# Altium footprint library SAMTEC SMD.PcbLib: 165 footprints (part 11 of 17)
Each footprint in its own frame and in the unit in brackets; x right, y up, seen from the top. Pads: shape width x height; smd on the part's side, far side on the other; paste and mask are expansions set on the pad; w line width, h text height; cw(c..) or ccw(c..) is an arc to the next point about the centre after c.
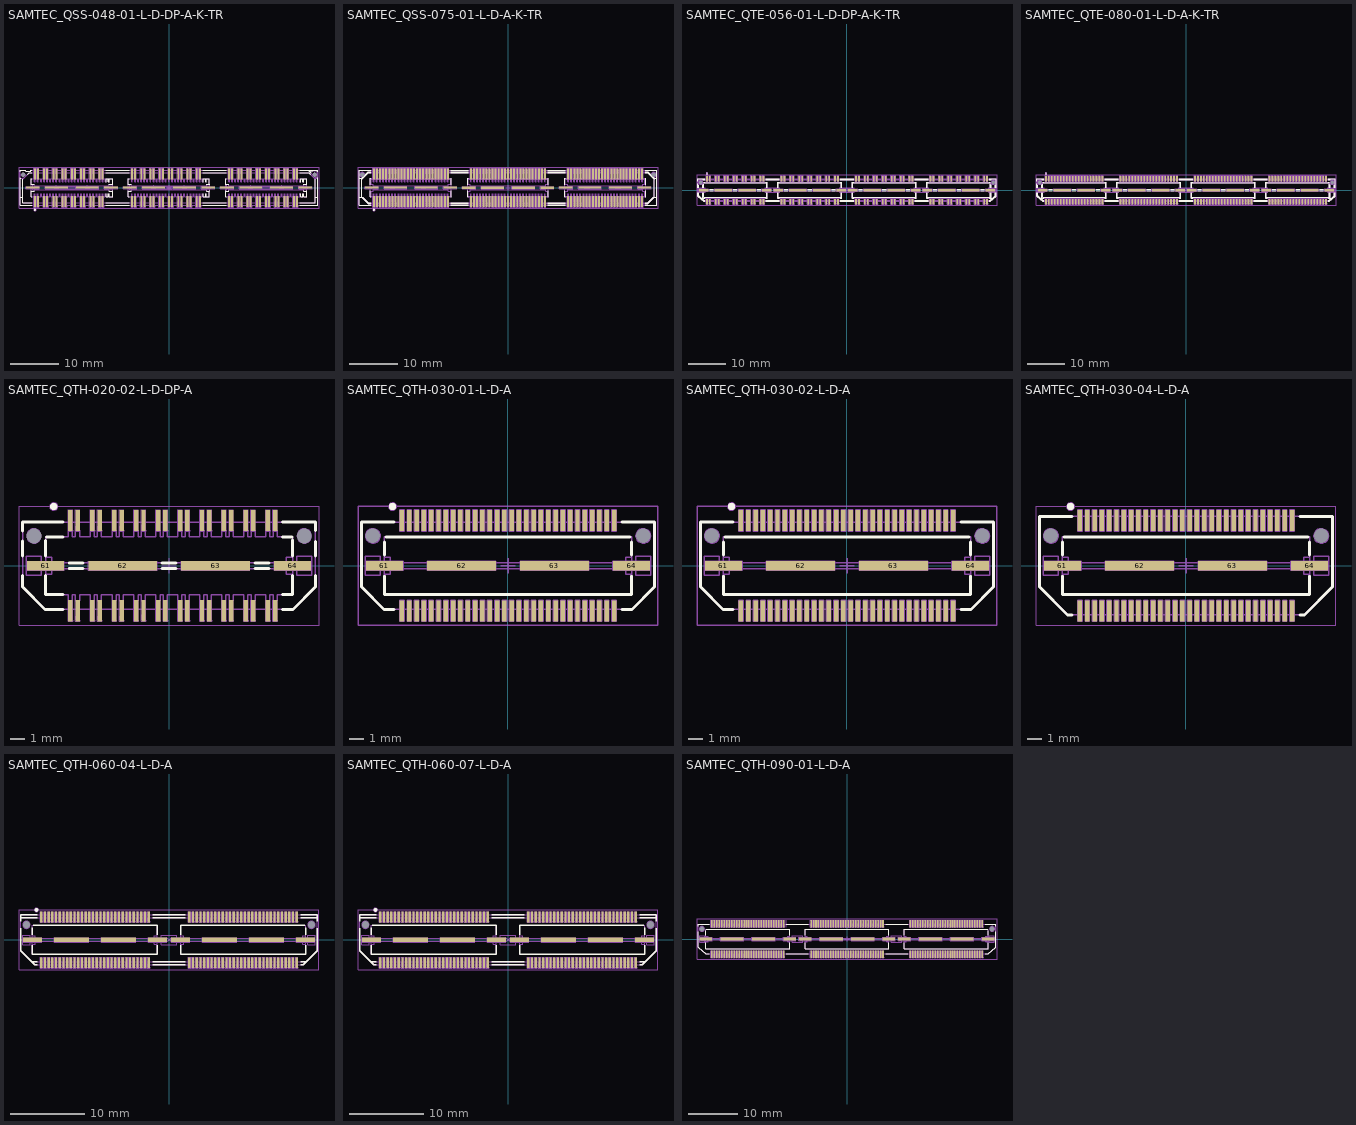
[diagram p10: the footprints below, top view; thin cyan lines are the x and y axes]

## SAMTEC_QSS-048-01-L-D-DP-A-K-TR [mm] "96 Contacts Female, Pitch 0.635mm, Straight Double Row Differential Pair High Speed Board to Board Socket"
height 3.63
pads (110):
  rect 0.406x2.273 smd mask+0: 1(-27.623,-2.865) 2(-27.623,2.865) 3(-26.988,-2.865) 4(-26.988,2.865) 5(-25.718,-2.865) 6(-25.718,2.865) 7(-25.083,-2.865) 8(-25.083,2.865) 9(-23.813,-2.865) 10(-23.813,2.865) 11(-23.178,-2.865) 12(-23.178,2.865) 13(-21.908,-2.865) 14(-21.908,2.865) 15(-21.273,-2.865) 16(-21.273,2.865) 17(-20.003,-2.865) 18(-20.003,2.865) 19(-19.368,-2.865) 20(-19.368,2.865) 21(-18.098,-2.865) 22(-18.098,2.865) 23(-17.463,-2.865) 24(-17.463,2.865) 25(-16.193,-2.865) 26(-16.193,2.865) 27(-15.558,-2.865) 28(-15.558,2.865) 29(-14.288,-2.865) 30(-14.288,2.865) 31(-13.653,-2.865) 32(-13.653,2.865) 33(-7.62,-2.865) 34(-7.62,2.865) 35(-6.985,-2.865) 36(-6.985,2.865) 37(-5.715,-2.865) 38(-5.715,2.865) 39(-5.08,-2.865) 40(-5.08,2.865) 41(-3.81,-2.865) 42(-3.81,2.865) 43(-3.175,-2.865) 44(-3.175,2.865) 45(-1.905,-2.865) 46(-1.905,2.865) 47(-1.27,-2.865) 48(-1.27,2.865) 49(0,-2.865) 50(0,2.865) 51(0.635,-2.865) 52(0.635,2.865) 53(1.905,-2.865) 54(1.905,2.865) 55(2.54,-2.865) 56(2.54,2.865) 57(3.81,-2.865) 58(3.81,2.865) 59(4.445,-2.865) 60(4.445,2.865) 61(5.715,-2.865) 62(5.715,2.865) 63(6.35,-2.865) 64(6.35,2.865) 65(12.383,-2.865) 66(12.383,2.865) 67(13.018,-2.865) 68(13.018,2.865) 69(14.288,-2.865) 70(14.288,2.865) 71(14.923,-2.865) 72(14.923,2.865) 73(16.193,-2.865) 74(16.193,2.865) 75(16.828,-2.865) 76(16.828,2.865) 77(18.098,-2.865) 78(18.098,2.865) 79(18.733,-2.865) 80(18.733,2.865) 81(20.003,-2.865) 82(20.003,2.865) 83(20.638,-2.865) 84(20.638,2.865) 85(21.908,-2.865) 86(21.908,2.865) 87(22.543,-2.865) 88(22.543,2.865) 89(23.813,-2.865) 90(23.813,2.865) 91(24.448,-2.865) 92(24.448,2.865) 93(25.718,-2.865) 94(25.718,2.865) 95(26.353,-2.865) 96(26.353,2.865)
  rect 2.794x0.432 smd mask+0: 97(-28.067,0) 100(-11.938,0) 101(-8.065,0) 104(8.065,0) 105(11.938,0) 108(28.067,0)
  rect 4.699x0.432 smd mask+0: 98(-23.178,0) 99(-16.825,0) 102(-3.175,0) 103(3.175,0) 106(16.828,0) 107(23.178,0)
  round 0.5 hole 1 unplated mask+0.25: 163(-30,2.657) 164(30,2.657)
Top Overlay:
  circle w0.25: c-27.603,-4.54 r0.125
  lines w0.2: -30.639,-1.968 -30.131,-1.968 ; -30.639,1.968 -30.571,1.968 ; -30.639,2.029 -30.639,-3.62 -28.226,-3.62 ; -30.639,3.305 -30.639,3.62 -29.496,3.62 -29.496,3.41 ; -29.436,3.366 -28.48,3.366 -28.48,3.62 -28.226,3.62 ; -28.321,-0.616 -28.321,-0.699 ; -28.321,0.616 -28.321,0.699 ; -28.226,-1.829 -28.321,-1.829 -28.321,-0.699 ; -28.226,1.829 -28.321,1.829 -28.321,0.699 ; -27.75,-0.616 -27.75,-0.699 -28.321,-0.699 ; -27.75,0.616 -27.75,0.699 -28.321,0.699 ; -13.05,-3.62 -8.223,-3.62 ; -13.05,-1.245 -12.916,-1.245 -12.916,-1.829 -12.484,-1.829 -12.484,-1.245 -12.281,-1.245 -12.281,-1.829 -11.576,-1.829 -11.576,-0.699 ; -13.05,1.245 -12.916,1.245 -12.916,1.829 -12.484,1.829 -12.484,1.245 -12.281,1.245 -12.281,1.829 -11.576,1.829 -11.576,0.699 ; -13.05,3.62 -8.223,3.62 ; -12.256,-0.616 -12.256,-0.699 -11.576,-0.699 ; -12.256,0.616 -12.256,0.699 -11.576,0.699 ; -11.576,-0.616 -11.576,-0.699 ; -11.576,0.616 -11.576,0.699 ; -8.426,-0.616 -8.426,-0.699 ; -8.426,0.616 -8.426,0.699 ; -8.223,-1.829 -8.426,-1.829 -8.426,-0.699 ; -8.223,1.829 -8.426,1.829 -8.426,0.699 ; -7.747,-0.616 -7.747,-0.699 -8.426,-0.699 ; -7.747,0.616 -7.747,0.699 -8.426,0.699 ; 6.953,-3.62 11.78,-3.62 ; 6.953,-1.245 7.087,-1.245 7.087,-1.829 7.518,-1.829 7.518,-1.245 7.722,-1.245 7.722,-1.829 8.322,-1.829 8.322,-0.699 ; 6.953,1.245 7.087,1.245 7.087,1.829 7.518,1.829 7.518,1.245 7.722,1.245 7.722,1.829 8.319,1.829 8.319,0.699 ; 6.953,3.62 11.78,3.62 ; 7.747,-0.616 7.747,-0.699 8.322,-0.699 ; 7.747,0.616 7.747,0.699 8.319,0.699 ; 8.319,0.616 8.319,0.699 ; 8.322,-0.616 8.322,-0.699 ; 11.684,-0.616 11.684,-0.699 ; 11.684,0.616 11.684,0.699 ; 11.78,-1.829 11.684,-1.829 11.684,-0.699 ; 11.78,1.829 11.684,1.829 11.684,0.699 ; 12.256,-0.616 12.256,-0.699 11.684,-0.699 ; 12.256,0.616 12.256,0.699 11.684,0.699 ; 26.956,-3.62 30.639,-3.62 30.639,2.029 ; 26.956,-1.245 27.089,-1.245 27.089,-1.829 27.521,-1.829 27.521,-1.245 27.724,-1.245 27.724,-1.829 28.321,-1.829 28.321,-0.699 ; 26.956,1.245 27.089,1.245 27.089,1.829 27.521,1.829 27.521,1.245 27.724,1.245 27.724,1.829 28.321,1.829 28.321,0.699 ; 26.956,3.62 30.639,3.62 30.639,3.305 ; 27.75,-0.616 27.75,-0.699 28.321,-0.699 ; 27.75,0.616 27.75,0.699 28.321,0.699 ; 28.321,-0.616 28.321,-0.699 ; 28.321,0.616 28.321,0.699 ; 29.202,3.075 28.816,3.461 29.58,3.461 ; 30.131,-1.968 30.639,-1.968 ; 30.428,3.461 30.48,3.461 30.48,3.431 ; 30.571,1.968 30.639,1.968 ; -30.131,-3.112 -28.226,-3.112 -30.131,-3.112 ; -30.131,-3.112 -30.131,1.714 ; -30.131,-3.112 -30.131,1.714 ; -30.131,1.714 -30.075,1.77 -30.131,1.714 ; -28.734,3.112 -28.226,3.112 -28.734,3.112 ; -28.734,3.112 -29.107,2.739 -28.734,3.112 ; 28.734,3.112 26.956,3.112 28.734,3.112 ; 28.734,3.112 29.107,2.739 28.734,3.112 ; 30.131,-3.112 30.131,1.714 ; 30.131,-3.112 30.131,1.714 ; 30.131,-3.112 26.956,-3.112 30.131,-3.112 ; 30.131,1.714 30.075,1.77 30.131,1.714 ; -13.05,-3.112 -8.223,-3.112 -13.05,-3.112 ; -13.05,3.112 -8.223,3.112 -13.05,3.112 ; 6.953,-3.112 11.78,-3.112 6.953,-3.112 ; 6.953,3.112 11.78,3.112 6.953,3.112
Mechanical 8:
  drawing of 684 lines, arcs and shapes, not listed
Mechanical 14:
  drawing of 755 lines, arcs and shapes, not listed
Mechanical 15:
  lines w0.05: -30.889,-4.252 30.889,-4.252 30.889,4.252 -30.889,4.252 -30.889,-4.252
3D body "SAMTEC_QSS-048-01-L-D-DP-A-K-TR.stp": height 3.63, standoff -0.75, extent -30.639,-3.746 30.639,3.747

## SAMTEC_QSS-075-01-L-D-A-K-TR [mm] "150 Contacts Female, Pitch 0.635mm, Straight Double Row High Speed Board to Board Socket"
height 3.63
pads (164):
  rect 0.406x2.273 smd mask+0: 1(-27.623,-2.865) 2(-27.623,2.865) 3(-26.988,-2.865) 4(-26.988,2.865) 5(-26.353,-2.865) 6(-26.353,2.865) 7(-25.718,-2.865) 8(-25.718,2.865) 9(-25.083,-2.865) 10(-25.083,2.865) 11(-24.448,-2.865) 12(-24.448,2.865) 13(-23.813,-2.865) 14(-23.813,2.865) 15(-23.178,-2.865) 16(-23.178,2.865) 17(-22.543,-2.865) 18(-22.543,2.865) 19(-21.908,-2.865) 20(-21.908,2.865) 21(-21.273,-2.865) 22(-21.273,2.865) 23(-20.638,-2.865) 24(-20.638,2.865) 25(-20.003,-2.865) 26(-20.003,2.865) 27(-19.368,-2.865) 28(-19.368,2.865) 29(-18.733,-2.865) 30(-18.733,2.865) 31(-18.098,-2.865) 32(-18.098,2.865) 33(-17.463,-2.865) 34(-17.463,2.865) 35(-16.828,-2.865) 36(-16.828,2.865) 37(-16.193,-2.865) 38(-16.193,2.865) 39(-15.558,-2.865) 40(-15.558,2.865) 41(-14.923,-2.865) 42(-14.923,2.865) 43(-14.288,-2.865) 44(-14.288,2.865) 45(-13.653,-2.865) 46(-13.653,2.865) 47(-13.018,-2.865) 48(-13.018,2.865) 49(-12.383,-2.865) 50(-12.383,2.865) 51(-7.62,-2.865) 52(-7.62,2.865) 53(-6.985,-2.865) 54(-6.985,2.865) 55(-6.35,-2.865) 56(-6.35,2.865) 57(-5.715,-2.865) 58(-5.715,2.865) 59(-5.08,-2.865) 60(-5.08,2.865) 61(-4.445,-2.865) 62(-4.445,2.865) 63(-3.81,-2.865) 64(-3.81,2.865) 65(-3.175,-2.865) 66(-3.175,2.865) 67(-2.54,-2.865) 68(-2.54,2.865) 69(-1.905,-2.865) 70(-1.905,2.865) 71(-1.27,-2.865) 72(-1.27,2.865) 73(-0.635,-2.865) 74(-0.635,2.865) 75(0,-2.865) 76(0,2.865) 77(0.635,-2.865) 78(0.635,2.865) 79(1.27,-2.865) 80(1.27,2.865) 81(1.905,-2.865) 82(1.905,2.865) 83(2.54,-2.865) 84(2.54,2.865) 85(3.175,-2.865) 86(3.175,2.865) 87(3.81,-2.865) 88(3.81,2.865) 89(4.445,-2.865) 90(4.445,2.865) 91(5.08,-2.865) 92(5.08,2.865) 93(5.715,-2.865) 94(5.715,2.865) 95(6.35,-2.865) 96(6.35,2.865) 97(6.985,-2.865) 98(6.985,2.865) 99(7.62,-2.865) 100(7.62,2.865) 101(12.383,-2.865) 102(12.383,2.865) 103(13.018,-2.865) 104(13.018,2.865) 105(13.653,-2.865) 106(13.653,2.865) 107(14.288,-2.865) 108(14.288,2.865) 109(14.923,-2.865) 110(14.923,2.865) 111(15.558,-2.865) 112(15.558,2.865) 113(16.193,-2.865) 114(16.193,2.865) 115(16.828,-2.865) 116(16.828,2.865) 117(17.463,-2.865) 118(17.463,2.865) 119(18.098,-2.865) 120(18.098,2.865) 121(18.733,-2.865) 122(18.733,2.865) 123(19.368,-2.865) 124(19.368,2.865) 125(20.003,-2.865) 126(20.003,2.865) 127(20.638,-2.865) 128(20.638,2.865) 129(21.273,-2.865) 130(21.273,2.865) 131(21.908,-2.865) 132(21.908,2.865) 133(22.543,-2.865) 134(22.543,2.865) 135(23.178,-2.865) 136(23.178,2.865) 137(23.813,-2.865) 138(23.813,2.865) 139(24.448,-2.865) 140(24.448,2.865) 141(25.083,-2.865) 142(25.083,2.865) 143(25.718,-2.865) 144(25.718,2.865) 145(26.353,-2.865) 146(26.353,2.865) 147(26.988,-2.865) 148(26.988,2.865) 149(27.623,-2.865) 150(27.623,2.865)
  rect 2.794x0.432 smd mask+0: 151(-28.065,-0.002) 154(-11.935,-0.002) 155(-8.068,-0.017) 158(8.062,-0.017) 159(11.935,0.002) 162(28.065,0.002)
  rect 4.699x0.432 smd mask+0: 152(-23.175,-0.002) 153(-16.825,-0.002) 156(-3.178,-0.017) 157(3.172,-0.017) 160(16.825,0.002) 161(23.175,0.002)
  round 0.5 hole 1 unplated mask+0.25: 163(-30,2.657) 164(30,2.657)
Top Overlay:
  circle w0.25: c-27.603,-4.54 r0.125
  lines w0.2: -30.639,-1.968 -29.877,-1.968 -28.734,-3.112 ; -30.639,1.968 -29.877,1.968 ; -30.131,-1.968 -30.131,1.714 -28.734,3.112 ; -30.084,-1.968 -28.794,-3.258 ; -30.084,1.968 -28.794,3.258 ; -28.321,-0.614 -28.321,-1.905 -28.225,-1.905 ; -28.321,0.617 -28.321,1.905 -28.225,1.905 ; -28.225,-3.62 -30.639,-3.62 -30.639,3.62 -28.225,3.62 ; -28.225,-3.258 -28.794,-3.258 ; -28.225,-3.112 -28.734,-3.112 ; -28.225,3.112 -28.734,3.112 ; -28.225,3.258 -28.794,3.258 ; -11.785,-3.62 -8.222,-3.62 ; -11.785,-3.258 -8.222,-3.258 ; -11.785,-3.112 -8.222,-3.112 ; -11.785,-1.905 -11.684,-1.905 -11.684,-0.614 ; -11.785,1.905 -11.684,1.905 -11.684,0.617 ; -11.785,3.112 -8.222,3.112 ; -11.785,3.258 -8.222,3.258 ; -11.785,3.62 -8.222,3.62 ; -8.319,-0.614 -8.319,-1.905 -8.222,-1.905 ; -8.319,0.617 -8.319,1.905 -8.222,1.905 ; 8.218,-3.62 11.78,-3.62 ; 8.218,-3.258 11.78,-3.258 ; 8.218,-3.112 11.78,-3.112 ; 8.218,-1.905 8.319,-1.905 8.319,-0.614 ; 8.218,1.905 8.319,1.905 8.319,0.617 ; 8.218,3.112 11.78,3.112 ; 8.218,3.258 11.78,3.258 ; 8.218,3.62 11.78,3.62 ; 11.684,-0.614 11.684,-1.905 11.78,-1.905 ; 11.684,0.617 11.684,1.905 11.78,1.905 ; 28.22,-3.62 30.639,-3.62 30.639,3.62 28.22,3.62 ; 28.22,-3.258 28.794,-3.258 ; 28.22,-3.112 28.734,-3.112 ; 28.22,-1.905 28.321,-1.905 28.321,-0.614 ; 28.22,1.905 28.321,1.905 28.321,0.617 ; 28.22,3.112 28.734,3.112 ; 28.22,3.258 28.794,3.258 ; 29.877,1.968 30.639,1.968 ; 30.084,-1.968 28.794,-3.258 ; 30.084,1.968 28.794,3.258 ; 30.131,-1.968 30.131,1.714 28.734,3.112 ; 30.639,-1.968 29.877,-1.968 28.734,-3.112 ; -28.794,-3.258 -28.734,-3.112 ; -28.794,3.258 -28.734,3.112 ; 28.734,-3.112 28.794,-3.258 ; 28.734,3.112 28.794,3.258
Mechanical 8:
  drawing of 986 lines, arcs and shapes, not listed
Mechanical 14:
  drawing of 843 lines, arcs and shapes, not listed
Mechanical 15:
  lines w0.05: -30.889,-4.249 -30.889,4.252 30.889,4.252 30.889,-4.249 -30.889,-4.249
3D body "SAMTEC_QSS-075-01-L-D-A-K-TR.stp": height 3.63, standoff -0.75, extent -30.639,-3.746 30.639,3.747

## SAMTEC_QTE-056-01-L-D-DP-A-K-TR [mm] "112 Contacts Female, Pitch 0.8mm, Straight Double Row Differential Pair High Speed Ground Plane Header"
height 4.27
pads (130):
  rect 0.46x1.45 smd mask+0: 1(-37.6,3.085) 2(-37.6,-3.085) 3(-36.8,3.085) 4(-36.8,-3.085) 5(-35.2,3.085) 6(-35.2,-3.085) 7(-34.4,3.085) 8(-34.4,-3.085) 9(-32.8,3.085) 10(-32.8,-3.085) 11(-32,3.085) 12(-32,-3.085) 13(-30.4,3.085) 14(-30.4,-3.085) 15(-29.6,3.085) 16(-29.6,-3.085) 17(-28,3.085) 18(-28,-3.085) 19(-27.2,3.085) 20(-27.2,-3.085) 21(-25.6,3.085) 22(-25.6,-3.085) 23(-24.8,3.085) 24(-24.8,-3.085) 25(-23.2,3.085) 26(-23.2,-3.085) 27(-22.4,3.085) 28(-22.4,-3.085) 29(-17.6,3.085) 30(-17.6,-3.085) 31(-16.8,3.085) 32(-16.8,-3.085) 33(-15.2,3.085) 34(-15.2,-3.085) 35(-14.4,3.085) 36(-14.4,-3.085) 37(-12.8,3.085) 38(-12.8,-3.085) 39(-12,3.085) 40(-12,-3.085) 41(-10.4,3.085) 42(-10.4,-3.085) 43(-9.6,3.085) 44(-9.6,-3.085) 45(-8,3.085) 46(-8,-3.085) 47(-7.2,3.085) 48(-7.2,-3.085) 49(-5.6,3.085) 50(-5.6,-3.085) 51(-4.8,3.085) 52(-4.8,-3.085) 53(-3.2,3.085) 54(-3.2,-3.085) 55(-2.4,3.085) 56(-2.4,-3.085) 57(2.4,3.085) 58(2.4,-3.085) 59(3.2,3.085) 60(3.2,-3.085) 61(4.8,3.085) 62(4.8,-3.085) 63(5.6,3.085) 64(5.6,-3.085) 65(7.2,3.085) 66(7.2,-3.085) 67(8,3.085) 68(8,-3.085) 69(9.6,3.085) 70(9.6,-3.085) 71(10.4,3.085) 72(10.4,-3.085) 73(12,3.085) 74(12,-3.085) 75(12.8,3.085) 76(12.8,-3.085) 77(14.4,3.085) 78(14.4,-3.085) 79(15.2,3.085) 80(15.2,-3.085) 81(16.8,3.085) 82(16.8,-3.085) 83(17.6,3.085) 84(17.6,-3.085) 85(22.4,3.085) 86(22.4,-3.085) 87(23.2,3.085) 88(23.2,-3.085) 89(24.8,3.085) 90(24.8,-3.085) 91(25.6,3.085) 92(25.6,-3.085) 93(27.2,3.085) 94(27.2,-3.085) 95(28,3.085) 96(28,-3.085) 97(29.6,3.085) 98(29.6,-3.085) 99(30.4,3.085) 100(30.4,-3.085) 101(32,3.085) 102(32,-3.085) 103(32.8,3.085) 104(32.8,-3.085) 105(34.4,3.085) 106(34.4,-3.085) 107(35.2,3.085) 108(35.2,-3.085) 109(36.8,3.085) 110(36.8,-3.085) 111(37.6,3.085) 112(37.6,-3.085)
  rect 2.54x0.64 smd mask+0: 113(-38.445,0) 116(-21.555,0) 117(-18.445,0) 120(-1.555,0) 121(1.555,0) 124(18.445,0) 125(21.555,0) 128(38.445,0)
  rect 4.7x0.64 smd mask+0: 114(-33.175,0) 115(-26.825,0) 118(-13.175,0) 119(-6.825,0) 122(6.825,0) 123(13.175,0) 126(26.825,0) 127(33.175,0)
  round 0.5 hole 1 unplated mask+0.25: 129(-39.24,2.035) 130(39.24,2.035)
Top Overlay:
  circle w0.25: c-37.575,4.395 r0.125
  lines w0.2: -40.005,-0.67 -40.005,-1.64 -38.481,-2.985 -38.18,-2.985 ; -40.005,0.67 -40.005,1.664 ; -40.005,2.406 -40.005,2.985 -38.18,2.985 ; -39.751,-0.67 -39.751,-1.526 -38.385,-2.731 -38.18,-2.731 ; -39.751,0.67 -39.751,1.356 ; -38.751,2.731 -38.18,2.731 ; -38.652,-0.67 -38.652,-2.127 -38.18,-2.127 ; -38.652,0.67 -38.652,1.421 ; -38.494,-0.67 -38.494,-1.968 -21.514,-1.968 -21.514,-0.67 ; -38.494,0.67 -38.494,1.628 ; -38.395,2.127 -38.18,2.127 ; -38.393,1.968 -21.514,1.968 -21.514,0.67 ; -36.825,-0.191 -35.875,-0.191 ; -36.825,0.191 -35.875,0.191 ; -30.475,-0.191 -29.525,-0.191 ; -30.475,0.191 -29.525,0.191 ; -24.125,-0.191 -23.175,-0.191 ; -24.125,0.191 -23.175,0.191 ; -21.82,-2.985 -18.18,-2.985 ; -21.82,-2.731 -18.18,-2.731 ; -21.82,-2.127 -21.355,-2.127 -21.355,-0.67 ; -21.82,2.127 -21.355,2.127 -21.355,0.67 ; -21.82,2.731 -18.18,2.731 ; -21.82,2.985 -18.18,2.985 ; -18.65,-0.67 -18.65,-2.127 -18.18,-2.127 ; -18.65,0.67 -18.65,2.127 -18.18,2.127 ; -18.491,-0.67 -18.491,-1.968 -1.511,-1.968 -1.511,-0.67 ; -18.491,0.67 -18.491,1.968 -1.511,1.968 -1.511,0.67 ; -16.825,-0.191 -15.875,-0.191 ; -16.825,0.191 -15.875,0.191 ; -10.475,-0.191 -9.525,-0.191 ; -10.475,0.191 -9.525,0.191 ; -4.125,-0.191 -3.175,-0.191 ; -4.125,0.191 -3.175,0.191 ; -1.82,-2.985 1.82,-2.985 ; -1.82,-2.731 1.82,-2.731 ; -1.82,-2.127 -1.353,-2.127 -1.353,-0.67 ; -1.82,2.127 -1.353,2.127 -1.353,0.67 ; -1.82,2.731 1.82,2.731 ; -1.82,2.985 1.82,2.985 ; 1.353,-0.67 1.353,-2.127 1.82,-2.127 ; 1.353,0.67 1.353,2.127 1.82,2.127 ; 1.511,-0.67 1.511,-1.968 18.491,-1.968 18.491,-0.67 ; 1.511,0.67 1.511,1.968 18.491,1.968 18.491,0.67 ; 3.175,-0.191 4.125,-0.191 ; 3.175,0.191 4.125,0.191 ; 9.525,-0.191 10.475,-0.191 ; 9.525,0.191 10.475,0.191 ; 15.875,-0.191 16.825,-0.191 ; 15.875,0.191 16.825,0.191 ; 18.18,-2.985 21.82,-2.985 ; 18.18,-2.731 21.82,-2.731 ; 18.18,-2.127 18.65,-2.127 18.65,-0.67 ; 18.18,2.127 18.65,2.127 18.65,0.67 ; 18.18,2.731 21.82,2.731 ; 18.18,2.985 21.82,2.985 ; 21.355,-0.67 21.355,-2.127 21.82,-2.127 ; 21.355,0.67 21.355,2.127 21.82,2.127 ; 21.514,-0.67 21.514,-1.968 38.494,-1.968 38.494,-0.67 ; 21.514,0.67 21.514,1.968 38.393,1.968 ; 23.175,-0.191 24.125,-0.191 ; 23.175,0.191 24.125,0.191 ; 29.525,-0.191 30.475,-0.191 ; 29.525,0.191 30.475,0.191 ; 35.875,-0.191 36.825,-0.191 ; 35.875,0.191 36.825,0.191 ; 38.18,-2.985 38.481,-2.985 40.005,-1.64 40.005,-0.67 ; 38.18,-2.731 38.385,-2.731 39.751,-1.526 39.751,-0.67 ; 38.18,-2.127 38.652,-2.127 38.652,-0.67 ; 38.18,2.127 38.395,2.127 ; 38.18,2.731 38.751,2.731 ; 38.18,2.985 40.005,2.985 40.005,0.67 ; 38.494,0.67 38.494,1.628 ; 38.652,0.67 38.652,1.421 ; 39.751,0.67 39.751,1.356
Mechanical 8:
  drawing of 782 lines, arcs and shapes, not listed
Mechanical 14:
  drawing of 238 lines, arcs and shapes, not listed
Mechanical 15:
  lines w0.05: -40.255,-4.06 40.255,-4.06 40.255,4.06 -40.255,4.06 -40.255,-4.06
3D body "SAMTEC_QTE-056-01-L-D-DP-A-K-TR.stp": height 4.27, standoff -0.71, extent -40.005,-3.556 40.005,3.556

## SAMTEC_QTE-080-01-L-D-A-K-TR [mm] "160 Contacts Female, Pitch 0.8mm, Straight Double Row High Speed Ground Plane Header"
height 4.27
pads (178):
  rect 0.46x1.45 smd mask+0: 1(-37.6,3.085) 2(-37.6,-3.085) 3(-36.8,3.085) 4(-36.8,-3.085) 5(-36,3.085) 6(-36,-3.085) 7(-35.2,3.085) 8(-35.2,-3.085) 9(-34.4,3.085) 10(-34.4,-3.085) 11(-33.6,3.085) 12(-33.6,-3.085) 13(-32.8,3.085) 14(-32.8,-3.085) 15(-32,3.085) 16(-32,-3.085) 17(-31.2,3.085) 18(-31.2,-3.085) 19(-30.4,3.085) 20(-30.4,-3.085) 21(-29.6,3.085) 22(-29.6,-3.085) 23(-28.8,3.085) 24(-28.8,-3.085) 25(-28,3.085) 26(-28,-3.085) 27(-27.2,3.085) 28(-27.2,-3.085) 29(-26.4,3.085) 30(-26.4,-3.085) 31(-25.6,3.085) 32(-25.6,-3.085) 33(-24.8,3.085) 34(-24.8,-3.085) 35(-24,3.085) 36(-24,-3.085) 37(-23.2,3.085) 38(-23.2,-3.085) 39(-22.4,3.085) 40(-22.4,-3.085) 41(-17.6,3.085) 42(-17.6,-3.085) 43(-16.8,3.085) 44(-16.8,-3.085) 45(-16,3.085) 46(-16,-3.085) 47(-15.2,3.085) 48(-15.2,-3.085) 49(-14.4,3.085) 50(-14.4,-3.085) 51(-13.6,3.085) 52(-13.6,-3.085) 53(-12.8,3.085) 54(-12.8,-3.085) 55(-12,3.085) 56(-12,-3.085) 57(-11.2,3.085) 58(-11.2,-3.085) 59(-10.4,3.085) 60(-10.4,-3.085) 61(-9.6,3.085) 62(-9.6,-3.085) 63(-8.8,3.085) 64(-8.8,-3.085) 65(-8,3.085) 66(-8,-3.085) 67(-7.2,3.085) 68(-7.2,-3.085) 69(-6.4,3.085) 70(-6.4,-3.085) 71(-5.6,3.085) 72(-5.6,-3.085) 73(-4.8,3.085) 74(-4.8,-3.085) 75(-4,3.085) 76(-4,-3.085) 77(-3.2,3.085) 78(-3.2,-3.085) 79(-2.4,3.085) 80(-2.4,-3.085) 81(2.4,3.085) 82(2.4,-3.085) 83(3.2,3.085) 84(3.2,-3.085) 85(4,3.085) 86(4,-3.085) 87(4.8,3.085) 88(4.8,-3.085) 89(5.6,3.085) 90(5.6,-3.085) 91(6.4,3.085) 92(6.4,-3.085) 93(7.2,3.085) 94(7.2,-3.085) 95(8,3.085) 96(8,-3.085) 97(8.8,3.085) 98(8.8,-3.085) 99(9.6,3.085) 100(9.6,-3.085) 101(10.4,3.085) 102(10.4,-3.085) 103(11.2,3.085) 104(11.2,-3.085) 105(12,3.085) 106(12,-3.085) 107(12.8,3.085) 108(12.8,-3.085) 109(13.6,3.085) 110(13.6,-3.085) 111(14.4,3.085) 112(14.4,-3.085) 113(15.2,3.085) 114(15.2,-3.085) 115(16,3.085) 116(16,-3.085) 117(16.8,3.085) 118(16.8,-3.085) 119(17.6,3.085) 120(17.6,-3.085) 121(22.4,3.085) 122(22.4,-3.085) 123(23.2,3.085) 124(23.2,-3.085) 125(24,3.085) 126(24,-3.085) 127(24.8,3.085) 128(24.8,-3.085) 129(25.6,3.085) 130(25.6,-3.085) 131(26.4,3.085) 132(26.4,-3.085) 133(27.2,3.085) 134(27.2,-3.085) 135(28,3.085) 136(28,-3.085) 137(28.8,3.085) 138(28.8,-3.085) 139(29.6,3.085) 140(29.6,-3.085) 141(30.4,3.085) 142(30.4,-3.085) 143(31.2,3.085) 144(31.2,-3.085) 145(32,3.085) 146(32,-3.085) 147(32.8,3.085) 148(32.8,-3.085) 149(33.6,3.085) 150(33.6,-3.085) 151(34.4,3.085) 152(34.4,-3.085) 153(35.2,3.085) 154(35.2,-3.085) 155(36,3.085) 156(36,-3.085) 157(36.8,3.085) 158(36.8,-3.085) 159(37.6,3.085) 160(37.6,-3.085)
  rect 2.54x0.64 smd mask+0: 161(-38.445,0) 164(-21.555,0) 165(-18.445,0) 168(-1.555,0) 169(1.555,0) 172(18.445,0) 173(21.555,0) 176(38.445,0)
  rect 4.7x0.64 smd mask+0: 162(-33.175,0) 163(-26.825,0) 166(-13.175,0) 167(-6.825,0) 170(6.825,0) 171(13.175,0) 174(26.825,0) 175(33.175,0)
  round 0.5 hole 1 unplated mask+0.25: 177(-39.24,2.035) 178(39.24,2.035)
Top Overlay:
  circle w0.25: c-37.575,4.395 r0.125
  lines w0.2: -40.005,-0.67 -40.005,-1.641 -38.481,-2.985 -38.18,-2.985 ; -40.005,0.67 -40.005,1.664 ; -40.005,2.405 -40.005,2.984 -38.18,2.984 ; -39.751,-0.67 -39.751,-1.526 -38.385,-2.731 -38.18,-2.731 ; -39.751,0.67 -39.751,1.356 ; -38.751,2.73 -38.18,2.73 ; -38.653,-0.67 -38.653,-2.127 -38.18,-2.127 ; -38.653,0.67 -38.653,1.421 ; -38.494,-0.67 -38.494,-1.969 -21.514,-1.969 -21.514,-0.67 ; -38.494,0.67 -38.494,1.628 ; -38.395,2.127 -38.18,2.127 ; -38.393,1.968 -21.514,1.968 -21.514,0.67 ; -36.825,-0.191 -35.875,-0.191 ; -36.825,0.19 -35.875,0.19 ; -30.475,-0.191 -29.525,-0.191 ; -30.475,0.19 -29.525,0.19 ; -24.125,-0.191 -23.175,-0.191 ; -24.125,0.19 -23.175,0.19 ; -21.82,-2.985 -18.18,-2.985 ; -21.82,-2.731 -18.18,-2.731 ; -21.82,-2.127 -21.355,-2.127 -21.355,-0.67 ; -21.82,2.127 -21.355,2.127 -21.355,0.67 ; -21.82,2.73 -18.18,2.73 ; -21.82,2.984 -18.18,2.984 ; -18.65,-0.67 -18.65,-2.127 -18.18,-2.127 ; -18.65,0.67 -18.65,2.127 -18.18,2.127 ; -18.491,-0.67 -18.491,-1.969 -1.511,-1.969 -1.511,-0.67 ; -18.491,0.67 -18.491,1.968 -1.511,1.968 -1.511,0.67 ; -16.825,-0.191 -15.875,-0.191 ; -16.825,0.19 -15.875,0.19 ; -10.475,-0.191 -9.525,-0.191 ; -10.475,0.19 -9.525,0.19 ; -4.125,-0.191 -3.175,-0.191 ; -4.125,0.19 -3.175,0.19 ; -1.82,-2.985 1.82,-2.985 ; -1.82,-2.731 1.82,-2.731 ; -1.82,-2.127 -1.353,-2.127 -1.353,-0.67 ; -1.82,2.127 -1.353,2.127 -1.353,0.67 ; -1.82,2.73 1.82,2.73 ; -1.82,2.984 1.82,2.984 ; 1.352,-0.67 1.352,-2.127 1.82,-2.127 ; 1.352,0.67 1.352,2.127 1.82,2.127 ; 1.511,-0.67 1.511,-1.969 18.491,-1.969 18.491,-0.67 ; 1.511,0.67 1.511,1.968 18.491,1.968 18.491,0.67 ; 3.175,-0.191 4.125,-0.191 ; 3.175,0.19 4.125,0.19 ; 9.525,-0.191 10.475,-0.191 ; 9.525,0.19 10.475,0.19 ; 15.875,-0.191 16.825,-0.191 ; 15.875,0.19 16.825,0.19 ; 18.18,-2.985 21.82,-2.985 ; 18.18,-2.731 21.82,-2.731 ; 18.18,-2.127 18.65,-2.127 18.65,-0.67 ; 18.18,2.127 18.65,2.127 18.65,0.67 ; 18.18,2.73 21.82,2.73 ; 18.18,2.984 21.82,2.984 ; 21.355,-0.67 21.355,-2.127 21.82,-2.127 ; 21.355,0.67 21.355,2.127 21.82,2.127 ; 21.514,-0.67 21.514,-1.969 38.494,-1.969 38.494,-0.67 ; 21.514,0.67 21.514,1.968 38.393,1.968 ; 23.175,-0.191 24.125,-0.191 ; 23.175,0.19 24.125,0.19 ; 29.525,-0.191 30.475,-0.191 ; 29.525,0.19 30.475,0.19 ; 35.875,-0.191 36.825,-0.191 ; 35.875,0.19 36.825,0.19 ; 38.18,-2.985 38.481,-2.985 40.005,-1.641 40.005,-0.67 ; 38.18,-2.731 38.385,-2.731 39.751,-1.526 39.751,-0.67 ; 38.18,-2.127 38.652,-2.127 38.652,-0.67 ; 38.18,2.127 38.395,2.127 ; 38.18,2.73 38.751,2.73 ; 38.18,2.984 40.005,2.984 40.005,0.67 ; 38.494,0.67 38.494,1.628 ; 38.652,0.67 38.652,1.421 ; 39.751,0.67 39.751,1.356
Mechanical 8:
  drawing of 1070 lines, arcs and shapes, not listed
Mechanical 14:
  drawing of 235 lines, arcs and shapes, not listed